# Altium footprint library CAP_TH.PcbLib: 219 footprints (part 2 of 14)
Each footprint in its own frame and in the unit in brackets; x right, y up, seen from the top. Pads: shape width x height; smd on the part's side, far side on the other; paste and mask are expansions set on the pad; w line width, h text height; cw(c..) or ccw(c..) is an arc to the next point about the centre after c.
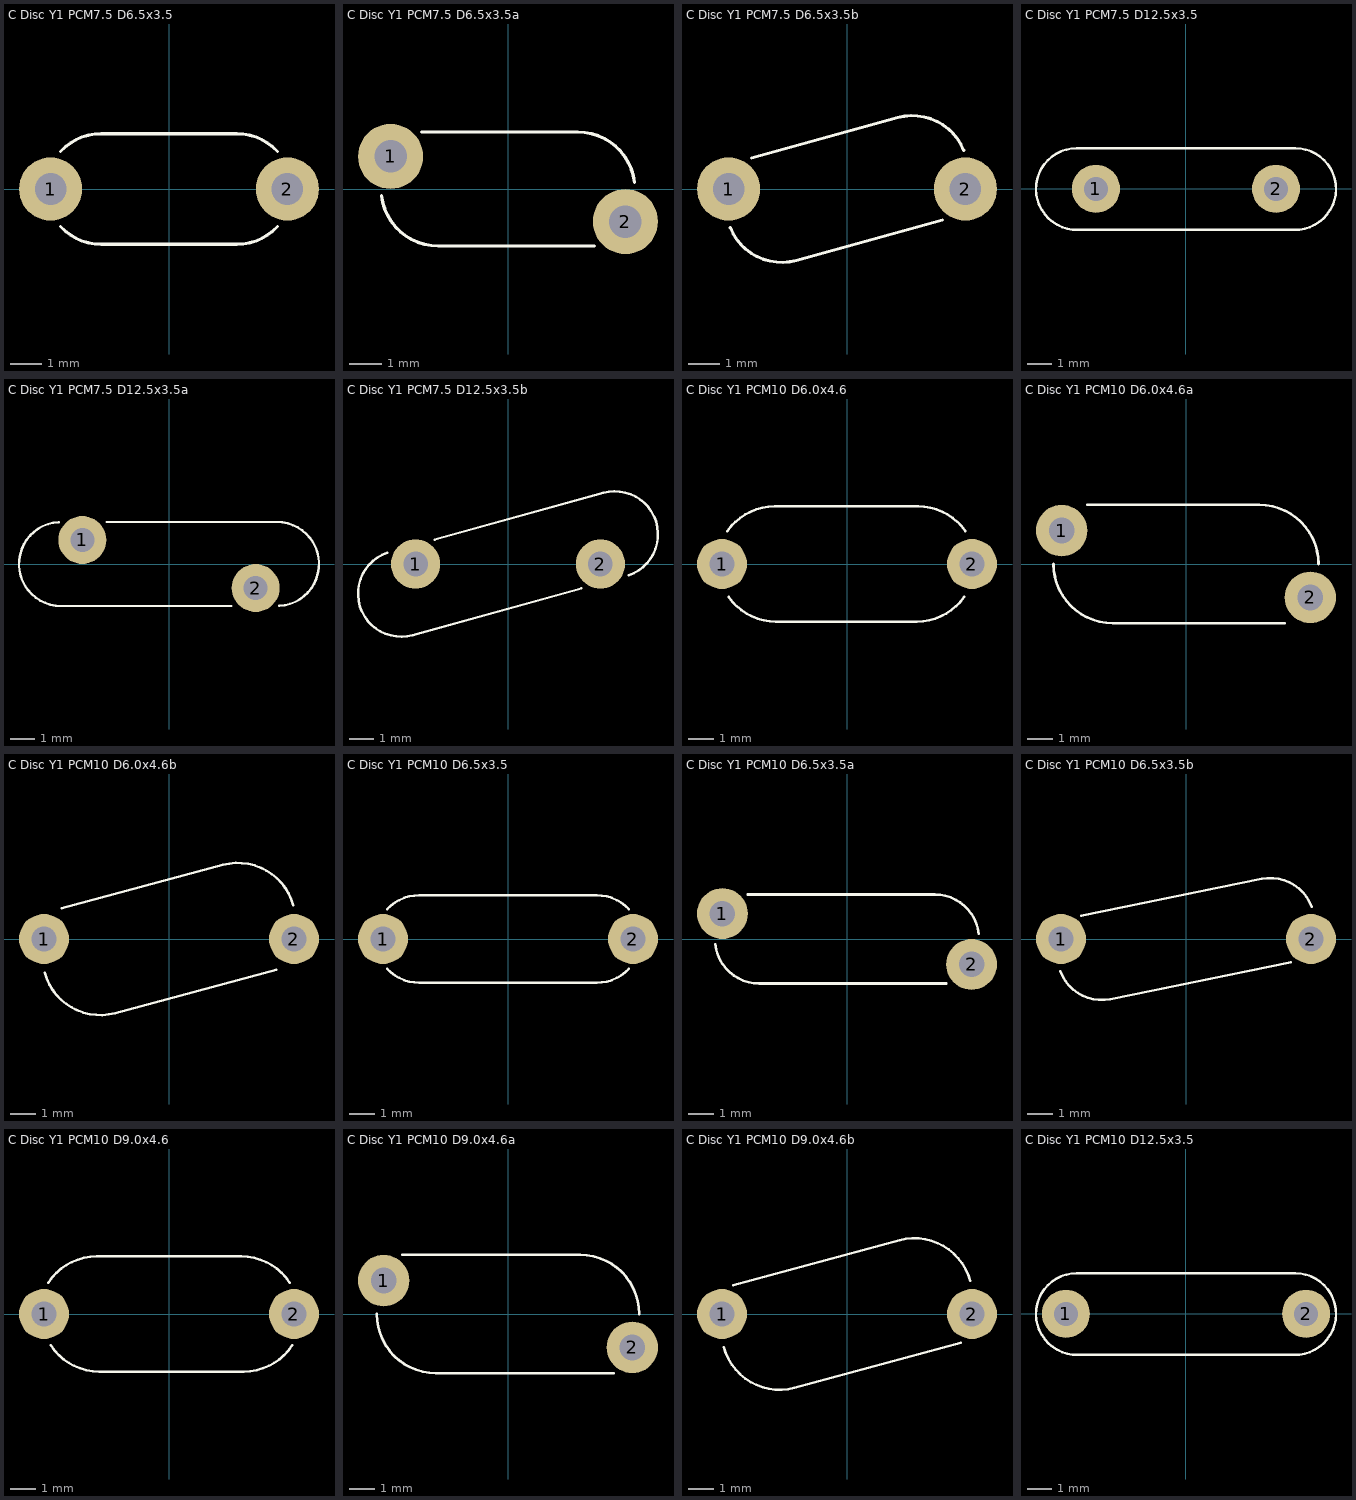
[diagram p1: the footprints below, top view; thin cyan lines are the x and y axes]

## C Disc Y1 PCM7.5 D6.5x3.5 [mm]
pads (2):
  round 2 hole 1: 1(-3.75,0) 2(3.75,0)
Top Overlay:
  lines w0.1: -3.436,-1.187 ccw(c-2.15,0) -2.15,-1.75 2.15,-1.75 ccw(c2.15,0) 3.436,-1.187 ; -3.436,1.187 cw(c-2.15,0) -2.15,1.75 2.15,1.75 cw(c2.15,0) 3.436,1.187
3D body "C Disc Y1 PCM7.5 D6.5x3.5.STEP": height 8.5, standoff -2, extent -4.05,-1.75 4.05,1.75

## C Disc Y1 PCM7.5 D6.5x3.5a [mm]
pads (2):
  round 2 hole 1: 1(-3.61,1) 2(3.61,-1)
Top Overlay:
  lines w0.1: -3.889,-0.199 ccw(c-2.15,0) -2.15,-1.75 2.65,-1.75 ; -2.65,1.75 2.15,1.75 cw(c2.15,0) 3.889,0.199
3D body "C Disc Y1 PCM7.5 D6.5x3.5(2.0).STEP": height 8.5, standoff -1.98, extent -3.914,-1.75 3.914,1.75

## C Disc Y1 PCM7.5 D6.5x3.5b [mm]
pads (2):
  round 2 hole 1: 1(-3.75,0) 2(3.75,0)
Top Overlay:
  lines w0.1: -3.695,-1.229 ccw(c-2.072,-0.573) -1.605,-2.26 3.021,-0.98 ; -3.021,0.98 1.605,2.26 cw(c2.072,0.573) 3.695,1.229
3D body "C Disc Y1 PCM7.5 D6.5x3.5(2.0).STEP": height 8.5, standoff -1.98, extent -4.239,-2.731 4.239,2.731

## C Disc Y1 PCM7.5 D12.5x3.5 [mm]
pads (2):
  round 2 hole 1: 1(-3.75,0) 2(3.75,0)
Top Overlay:
  lines w0.1: -4.547,1.69 ccw(c-4.547,-0.01) -4.502,-1.709 4.503,-1.709 ccw(c4.547,-0.01) 4.547,1.69 -4.547,1.69
3D body "C Disc Y1 PCM7.5 D12.5x3.5.STEP": height 14.5, standoff -2, extent -6.234,-1.75 6.234,1.75

## C Disc Y1 PCM7.5 D12.5x3.5a [mm]
pads (2):
  round 2 hole 1: 1(-3.61,1) 2(3.61,-1)
Top Overlay:
  lines w0.1: -4.6,1.747 ccw(c-4.5,0) -4.5,-1.75 2.6,-1.75 ; -2.6,1.75 4.5,1.75 cw(c4.5,0) 4.6,-1.747
3D body "C Disc Y1 PCM7.5 D12.5x3.5(2.0).STEP": height 14.5, standoff -1.98, extent -6.248,-1.75 6.247,1.75

## C Disc Y1 PCM7.5 D12.5x3.5b [mm]
pads (2):
  round 2 hole 1: 1(-3.75,0) 2(3.75,0)
Top Overlay:
  lines w0.1: -4.899,0.457 ccw(c-4.337,-1.2) -3.87,-2.887 2.973,-0.993 ; -2.973,0.993 3.87,2.887 cw(c4.337,1.2) 4.899,-0.457
3D body "C Disc Y1 PCM7.5 D12.5x3.5(2.0).STEP": height 14.5, standoff -1.98, extent -6.488,-3.353 6.488,3.353

## C Disc Y1 PCM10 D6.0x4.6 [mm]
pads (2):
  round 2 hole 1: 1(-5,0) 2(5,0)
Top Overlay:
  lines w0.1: -4.784,1.319 cw(c-2.9,0) -2.9,2.3 2.85,2.3 cw(c2.85,0) 4.734,1.319 ; -4.734,-1.319 ccw(c-2.85,0) -2.85,-2.3 2.8,-2.3 ccw(c2.8,0) 4.684,-1.319
3D body "C Disc Y1 PCM10 D6.0x4.6.STEP": height 7.99, standoff -2, extent -5.3,-2.3 5.3,2.3

## C Disc Y1 PCM10 D6.0x4.6a [mm]
pads (2):
  round 2 hole 1: 1(-4.83,1.3) 2(4.83,-1.3)
Top Overlay:
  lines w0.1: -5.15,0 ccw(c-2.85,0) -2.85,-2.3 3.83,-2.3 ; -3.83,2.3 2.85,2.3 cw(c2.85,0) 5.15,0
3D body "C Disc Y1 PCM10 D6.0x4.6(2.6).STEP": height 7.99, standoff -1.98, extent -5.128,-2.3 5.128,2.3

## C Disc Y1 PCM10 D6.0x4.6b [mm]
pads (2):
  round 2 hole 1: 1(-5,0) 2(5,0)
Top Overlay:
  lines w0.1: -4.972,-1.342 ccw(c-2.752,-0.742) -2.152,-2.963 4.297,-1.223 ; -4.297,1.223 2.152,2.963 cw(c2.752,0.742) 4.972,1.342
3D body "C Disc Y1 PCM10 D6.0x4.6(2.6).STEP": height 7.99, standoff -1.98, extent -5.55,-3.556 5.55,3.557

## C Disc Y1 PCM10 D6.5x3.5 [mm]
pads (2):
  round 2 hole 1: 1(-5,0) 2(5,0)
Top Overlay:
  lines w0.1: -4.834,-1.189 ccw(c-3.55,0) -3.55,-1.75 3.55,-1.75 ccw(c3.55,0) 4.834,-1.189 ; -4.834,1.189 cw(c-3.55,0) -3.55,1.75 3.55,1.75 cw(c3.55,0) 4.834,1.189
3D body "C Disc Y1 PCM10 D6.5x3.5.STEP": height 8.5, standoff -2, extent -5.3,-1.75 5.3,1.75

## C Disc Y1 PCM10 D6.5x3.5a [mm]
pads (2):
  round 2 hole 1: 1(-4.9,1) 2(4.9,-1)
Top Overlay:
  lines w0.1: -5.189,-0.199 ccw(c-3.45,0) -3.45,-1.75 3.9,-1.75 ; -3.9,1.75 3.45,1.75 cw(c3.45,0) 5.189,0.199
3D body "C Disc Y1 PCM10 D6.5x3.5(2.0).STEP": height 8.5, standoff -1.98, extent -5.199,-1.75 5.199,1.75

## C Disc Y1 PCM10 D6.5x3.5b [mm]
pads (2):
  round 2 hole 1: 1(-5,0) 2(5,0)
Top Overlay:
  lines w0.1: -5.025,-1.289 ccw(c-3.38,-0.69) -3.03,-2.405 4.196,-0.929 ; -4.196,0.929 3.03,2.405 cw(c3.38,0.69) 5.025,1.289
3D body "C Disc Y1 PCM10 D6.5x3.5(2.0).STEP": height 8.5, standoff -1.98, extent -5.444,-2.755 5.444,2.755

## C Disc Y1 PCM10 D9.0x4.6 [mm]
pads (2):
  round 2 hole 1: 1(-5,0) 2(5,0)
Top Overlay:
  lines w0.1: -4.827,1.256 cw(c-2.9,0) -2.9,2.3 2.9,2.3 cw(c2.9,0) 4.827,1.256 ; -4.727,-1.256 ccw(c-2.8,0) -2.8,-2.3 3,-2.3 ccw(c3,0) 4.927,-1.256
3D body "C Disc Y1 PCM10 D9.0x4.6.STEP": height 11, standoff -2, extent -5.35,-2.3 5.35,2.3

## C Disc Y1 PCM10 D9.0x4.6a [mm]
pads (2):
  round 2 hole 1: 1(-4.83,1.3) 2(4.83,-1.3)
Top Overlay:
  lines w0.1: -5.1,0 ccw(c-2.8,0) -2.8,-2.3 4.1,-2.3 ; -4.1,2.3 2.8,2.3 cw(c2.8,0) 5.1,0
3D body "C Disc Y1 PCM10 D9.0x4.6(2.6).STEP": height 11, standoff -1.98, extent -5.128,-2.3 5.128,2.3

## C Disc Y1 PCM10 D9.0x4.6b [mm]
pads (2):
  round 2 hole 1: 1(-5,0) 2(5,0)
Top Overlay:
  lines w0.1: -4.925,-1.326 ccw(c-2.704,-0.728) -2.106,-2.949 4.557,-1.155 ; -4.557,1.155 2.106,2.949 cw(c2.704,0.728) 4.925,1.326
3D body "C Disc Y1 PCM10 D9.0x4.6(2.6).STEP": height 11, standoff -1.98, extent -5.55,-3.554 5.55,3.554

## C Disc Y1 PCM10 D12.5x3.5 [mm]
pads (2):
  round 2 hole 1: 1(-5,0) 2(5,0)
Top Overlay:
  lines w0.1: -4.547,1.69 ccw(c-4.547,-0.01) -4.502,-1.709 4.503,-1.709 ccw(c4.547,-0.01) 4.547,1.69 -4.547,1.69
3D body "C Disc Y1 PCM10 D12.5x3.5.STEP": height 14.5, standoff -2, extent -6.244,-1.75 6.244,1.75